# Altium footprint library PcbLibUltimate (1).pcblib: 202 footprints (part 7 of 13)
Each footprint in its own frame and in the unit in brackets; x right, y up, seen from the top. Pads: shape width x height; smd on the part's side, far side on the other; paste and mask are expansions set on the pad; w line width, h text height; cw(c..) or ccw(c..) is an arc to the next point about the centre after c.
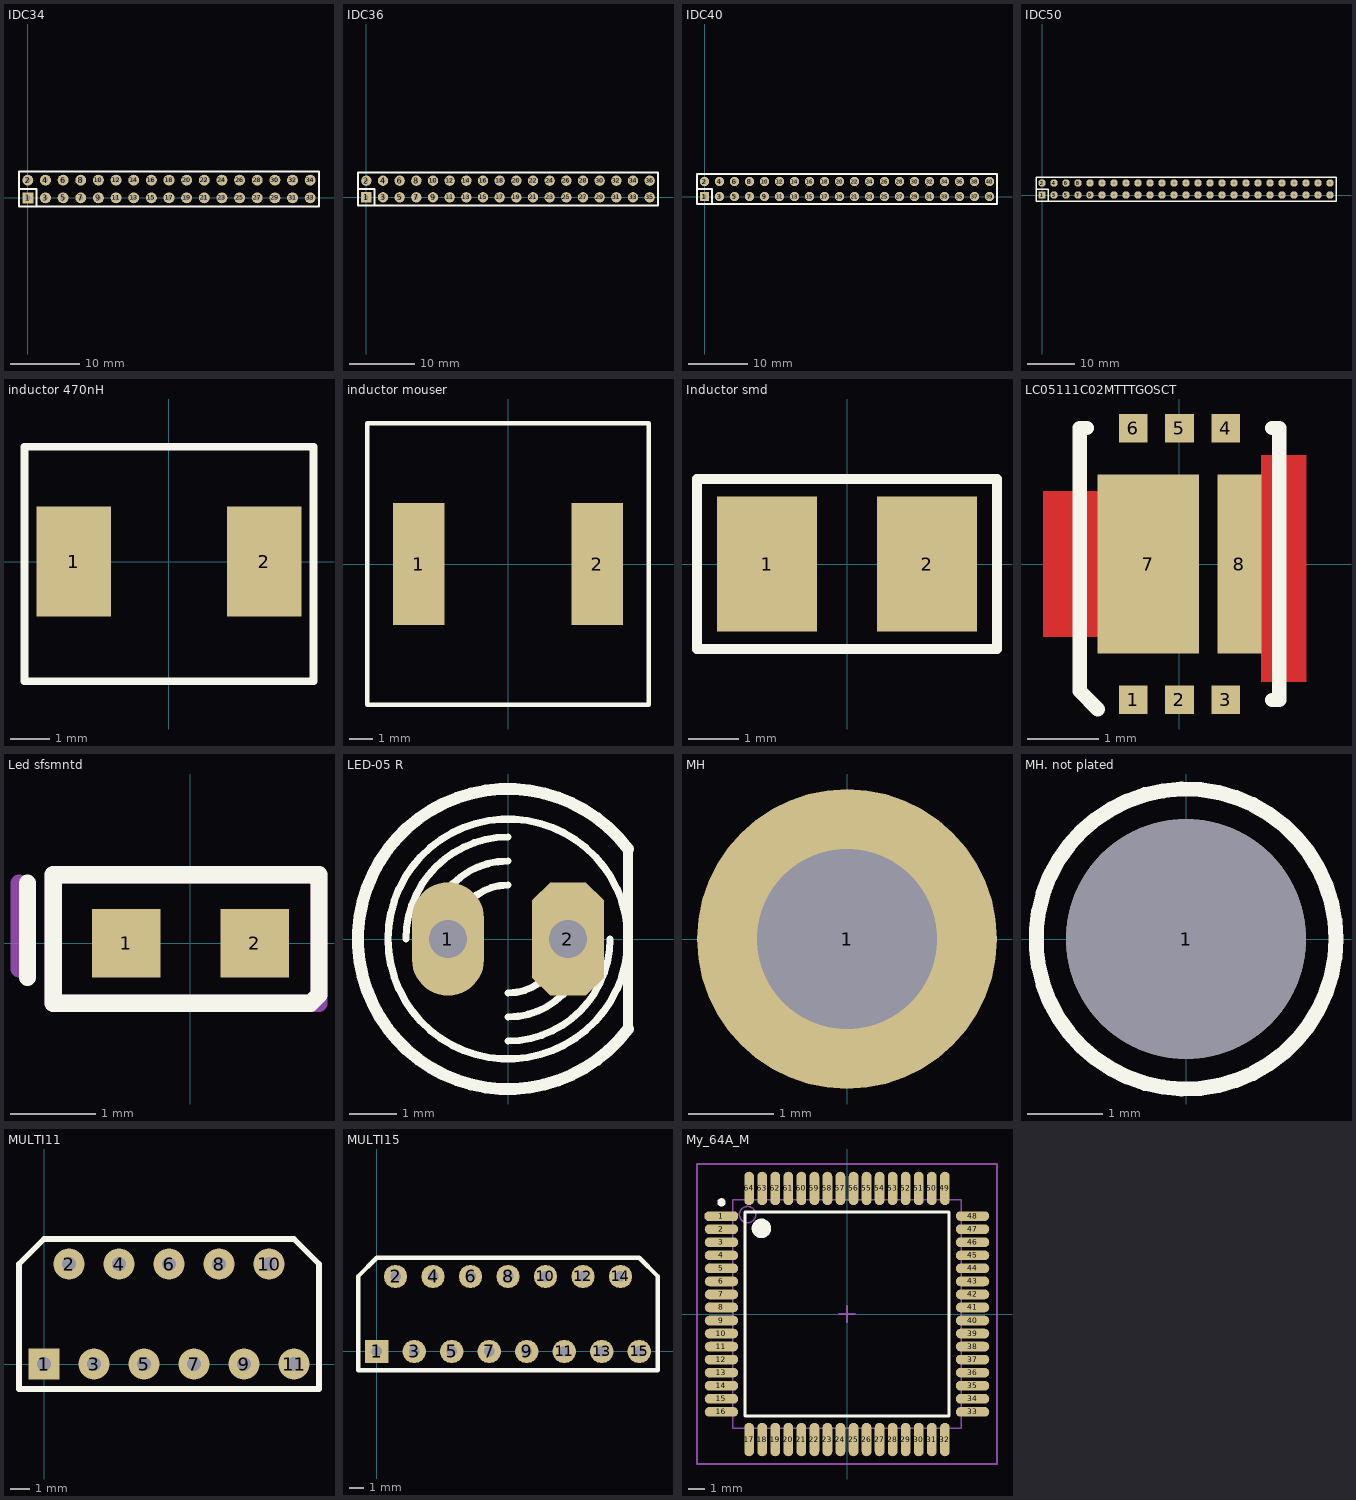
[diagram p6: the footprints below, top view; thin cyan lines are the x and y axes]

## IDC34 [mil]
pads (34):
  rect 62x62 hole 28: 1(0,0)
  round 62 hole 28: 2(0,100) 3(100,0) 4(100,100) 5(200,0) 6(200,100) 7(300,0) 8(300,100) 9(400,0) 10(400,100) 11(500,0) 12(500,100) 13(600,0) 14(600,100) 15(700,0) 16(700,100) 17(800,0) 18(800,100) 19(900,0) 20(900,100) 21(1000,0) 22(1000,100) 23(1100,0) 24(1100,100) 25(1200,0) 26(1200,100) 27(1300,0) 28(1300,100) 29(1400,0) 30(1400,100) 31(1500,0) 32(1500,100) 33(1600,0) 34(1600,100)
Top Overlay:
  lines w12: -50,50 50,50 50,-50 ; -50,-50 -50,150 1650,150 1650,-50 -50,-50

## IDC36 [mil]
pads (36):
  rect 62x62 hole 28: 1(0,0)
  round 62 hole 28: 2(0,100) 3(100,0) 4(100,100) 5(200,0) 6(200,100) 7(300,0) 8(300,100) 9(400,0) 10(400,100) 11(500,0) 12(500,100) 13(600,0) 14(600,100) 15(700,0) 16(700,100) 17(800,0) 18(800,100) 19(900,0) 20(900,100) 21(1000,0) 22(1000,100) 23(1100,0) 24(1100,100) 25(1200,0) 26(1200,100) 27(1300,0) 28(1300,100) 29(1400,0) 30(1400,100) 31(1500,0) 32(1500,100) 33(1600,0) 34(1600,100) 35(1700,0) 36(1700,100)
Top Overlay:
  lines w12: -50,50 50,50 50,-50 ; -50,-50 -50,150 1750,150 1750,-50 -50,-50

## IDC40 [mil]
pads (40):
  rect 62x62 hole 28: 1(0,0)
  round 62 hole 28: 2(0,100) 3(100,0) 4(100,100) 5(200,0) 6(200,100) 7(300,0) 8(300,100) 9(400,0) 10(400,100) 11(500,0) 12(500,100) 13(600,0) 14(600,100) 15(700,0) 16(700,100) 17(800,0) 18(800,100) 19(900,0) 20(900,100) 21(1000,0) 22(1000,100) 23(1100,0) 24(1100,100) 25(1200,0) 26(1200,100) 27(1300,0) 28(1300,100) 29(1400,0) 30(1400,100) 31(1500,0) 32(1500,100) 33(1600,0) 34(1600,100) 35(1700,0) 36(1700,100) 37(1800,0) 38(1800,100) 39(1900,0) 40(1900,100)
Top Overlay:
  lines w12: -50,50 50,50 50,-50 ; -50,-50 -50,150 1950,150 1950,-50 -50,-50

## IDC50 [mil]
pads (50):
  rect 62x62 hole 28: 1(0,0)
  round 62 hole 28: 2(0,100) 3(100,0) 4(100,100) 5(200,0) 6(200,100) 7(300,0) 8(300,100) 9(400,0) 10(400,100) 11(500,0) 12(500,100) 13(600,0) 14(600,100) 15(700,0) 16(700,100) 17(800,0) 18(800,100) 19(900,0) 20(900,100) 21(1000,0) 22(1000,100) 23(1100,0) 24(1100,100) 25(1200,0) 26(1200,100) 27(1300,0) 28(1300,100) 29(1400,0) 30(1400,100) 31(1500,0) 32(1500,100) 33(1600,0) 34(1600,100) 35(1700,0) 36(1700,100) 37(1800,0) 38(1800,100) 39(1900,0) 40(1900,100) 41(2000,0) 42(2000,100) 43(2100,0) 44(2100,100) 45(2200,0) 46(2200,100) 47(2300,0) 48(2300,100) 49(2400,0) 50(2400,100)
Top Overlay:
  lines w12: -50,50 50,50 50,-50 ; -50,-50 -50,150 2450,150 2450,-50 -50,-50

## inductor 470nH [mm]
pads (2):
  rect 1.905x2.79 smd: 1(-2.425,0) 2(2.426,0)
Top Overlay:
  lines w0.2: -3.683,-3.048 -3.683,-0.8 -3.683,2.921 3.683,2.921 3.683,-3.048 0.889,-3.048 -3.683,-3.048
3D body "User Library-L Panasonic ETQP3MxxxKVN.STEP": height 3, standoff 0, extent -3.25,-3 3.25,3

## inductor mouser [mm]
pads (2):
  rect 2.2x5.2 smd: 1(-3.8,0) 2(3.8,0)
Top Overlay:
  lines w0.2: -6,-6 6,-6 6,6 -6,6 -6,-6
3D body "CDRH127_470M.step": height 7.42, standoff 0.01, extent -6,-6 6,6

## Inductor smd [mm]
pads (2):
  rect 2x2.7 smd: 1(-1.6,0) 2(1.6,0)
Top Overlay:
  lines w0.2: -3,-1.7 -3,1.7 3,1.7 3,-1.7 -3,-1.7
Mechanical 29:
  lines w0.2: -3,-1.7 3,-1.7 3,1.7 -3,1.7 -3,-1.7
  text "'.Designator'" at -3.3,-0.7 h1.52
3D body: height 2.5, standoff -0.01, extent 1,-1.3 1.6,1.3
3D body: height 2.5, standoff -0.01, extent -1,-1.3 1,1.3
3D body: height 2.5, standoff -0.01, extent -1.6,-1.3 -1,1.3

## LC7 [mil]
3D body "LC709511FQD-A00TWG.stp": height 39.37, standoff 0, extent -120.08,-120.07 120.08,120.09

## LC05111C02MTTTGOSCT [mm]
pads (8):
  rect 0.4x0.4 smd: 1(-0.65,-1.9) 2(0,-1.9) 3(0.65,-1.9) 4(0.65,1.9) 5(0,1.9) 6(-0.65,1.9)
  rect 1.415x2.5 smd: 7(-0.437,0)
  rect 0.615x2.5 smd mask+0.09: 8(0.837,0)
Top Layer:
  region: 0.635,1.143 1.143,1.143 1.143,1.524 1.778,1.524 1.778,-1.651 1.143,-1.651 1.143,-1.143 0.635,-1.143
  region: 0.127,1.016 -1.905,1.016 -1.905,-1.016 0.254,-1.016 0.254,1.016
Top Overlay:
  lines w0.2: -1.3,1.905 -1.397,1.905 -1.397,-1.651 -1.397,-1.778 -1.143,-2.032 ; 1.3,-1.905 1.397,-1.905 1.397,1.905 1.3,1.905
3D body "LC05111C02MTTTG.stp": height 0.9, standoff 0, extent -1.3,-1.9 1.3,1.9

## Led sfsmntd [mm]
pads (2):
  rect 0.8x0.8 smd: 1(-0.75,0) 2(0.75,0)
Top Overlay:
  lines w0.2: -1.9,-0.4 -1.9,0.7 ; -1.6,-0.7 -1.6,0.8 1.5,0.8 1.5,-0.6 1.4,-0.7 -1.6,-0.7
Mechanical 29:
  lines w0.2: -2,-0.3 -2,0.7 ; -1.6,-0.7 -1.6,0.8 1.5,0.8 1.5,-0.7 -1.6,-0.7
  text "'.Designator'" at 3.4,-0.9 h1.52
3D body: height 0.65, standoff 0, extent -1.8,1.6 -1.8,1.6
3D body "User Library-LED SMD 0603 super red.step": height 0.65, standoff 0, extent -0.85,-0.4 0.85,0.4
3D body: height 0.8, standoff 0.8, extent -0.2,-0.2 0.2,0.2

## LED-05 R [mil] "Light emitting diode dia 5mm red color"
pads (2):
  oval 60x94.49 hole 32.01: 1(-50,0)
  oct 60x94.49 hole 32.01: 2(50,0)
Top Overlay:
  circle w6: c0,0 r100
  lines w6: -85,0 cw(c0,0) 0,85 ; -65,0 cw(c0,0) 0,65 ; -45,0 cw(c0,0) 0,45 ; 0,-85 ccw(c0,0) 85,0 ; 0,-65 ccw(c0,0) 65,0 ; 0,-45 ccw(c0,0) 45,0
  lines w8: 100,-75 100,75
  lines w10: 100,-75 cw(c0,0) 100,75
3D body "SW3dPS-LEDd5R.STEP": height 484.75, standoff -97.93, extent -117.31,-118.49 96.08,118.5

## MH [mm]
pads (1):
  round 3.5 hole 2.1: 1(0,0)
3D body "abdo.step": height 3.04, standoff -2.96, extent -1.688,-1.65 1.651,1.651

## MH. not plated [mm]
pads (1):
  round 3.2 hole 3.2 unplated: 1(0,0)
Top Overlay:
  circle w0.2: c0,0 r2

## MULTI11 [mil]
pads (11):
  rect 62x62 hole 28: 1(0,0)
  round 62 hole 28: 2(50,200) 3(100,0) 4(150,200) 5(200,0) 6(250,200) 7(300,0) 8(350,200) 9(400,0) 10(450,200) 11(500,0)
Top Overlay:
  lines w12: -50,-50 -50,200 0,250 500,250 550,200 550,-50 -50,-50

## MULTI15 [mil]
pads (15):
  rect 62x62 hole 28: 1(0,0)
  round 62 hole 28: 2(50,200) 3(100,0) 4(150,200) 5(200,0) 6(250,200) 7(300,0) 8(350,200) 9(400,0) 10(450,200) 11(500,0) 12(550,200) 13(600,0) 14(650,200) 15(700,0)
Top Overlay:
  lines w12: -50,-50 -50,200 0,250 700,250 750,200 750,-50 -50,-50

## My_64A_M [mm]
pads (64):
  oct 2.05x0.6 smd: 1(-7.7,6)
  oval 2.05x0.6 smd: 2(-7.7,5.2) 3(-7.7,4.4) 4(-7.7,3.6) 5(-7.7,2.8) 6(-7.7,2) 7(-7.7,1.2) 8(-7.7,0.4) 9(-7.7,-0.4) 10(-7.7,-1.2) 11(-7.7,-2) 12(-7.7,-2.8) 13(-7.7,-3.6) 14(-7.7,-4.4) 15(-7.7,-5.2) 16(-7.7,-6) 33(7.7,-6) 34(7.7,-5.2) 35(7.7,-4.4) 36(7.7,-3.6) 37(7.7,-2.8) 38(7.7,-2) 39(7.7,-1.2) 40(7.7,-0.4) 41(7.7,0.4) 42(7.7,1.2) 43(7.7,2) 44(7.7,2.8) 45(7.7,3.6) 46(7.7,4.4) 47(7.7,5.2) 48(7.7,6)
  oval 0.6x2.05 smd: 17(-6,-7.7) 18(-5.2,-7.7) 19(-4.4,-7.7) 20(-3.6,-7.7) 21(-2.8,-7.7) 22(-2,-7.7) 23(-1.2,-7.7) 24(-0.4,-7.7) 25(0.4,-7.7) 26(1.2,-7.7) 27(2,-7.7) 28(2.8,-7.7) 29(3.6,-7.7) 30(4.4,-7.7) 31(5.2,-7.7) 32(6,-7.7) 49(6,7.7) 50(5.2,7.7) 51(4.4,7.7) 52(3.6,7.7) 53(2.8,7.7) 54(2,7.7) 55(1.2,7.7) 56(0.4,7.7) 57(-0.4,7.7) 58(-1.2,7.7) 59(-2,7.7) 60(-2.8,7.7) 61(-3.6,7.7) 62(-4.4,7.7) 63(-5.2,7.7) 64(-6,7.7)
Top Overlay:
  circle w0.6: c-5.25,5.25 r0.3
  circle w0.25: c-7.7,6.85 r0.125
  lines w0.2: -6.25,-6.25 6.25,-6.25 6.25,6.25 -6.25,6.25 -6.25,-6.25
Mechanical 13:
  circle w0.1: c-6.1,6.1 r0.5
  lines w0.1: -7,-7 7,-7 7,7 -7,7 -7,-7
Mechanical 15:
  lines w0.1: -0.5,0 0.5,0 ; 0,-0.5 0,0.5 ; -9.2,-9.2 9.2,-9.2 9.2,9.2 -9.2,9.2 -9.2,-9.2
3D body: height 1.2, standoff 0, extent -7,-7 7,7